# Altium footprint library SparkFun-Retired.PCBLIB: 303 footprints (part 14 of 19)
Each footprint in its own frame and in the unit in brackets; x right, y up, seen from the top. Pads: shape width x height; smd on the part's side, far side on the other; paste and mask are expansions set on the pad; w line width, h text height; cw(c..) or ccw(c..) is an arc to the next point about the centre after c.
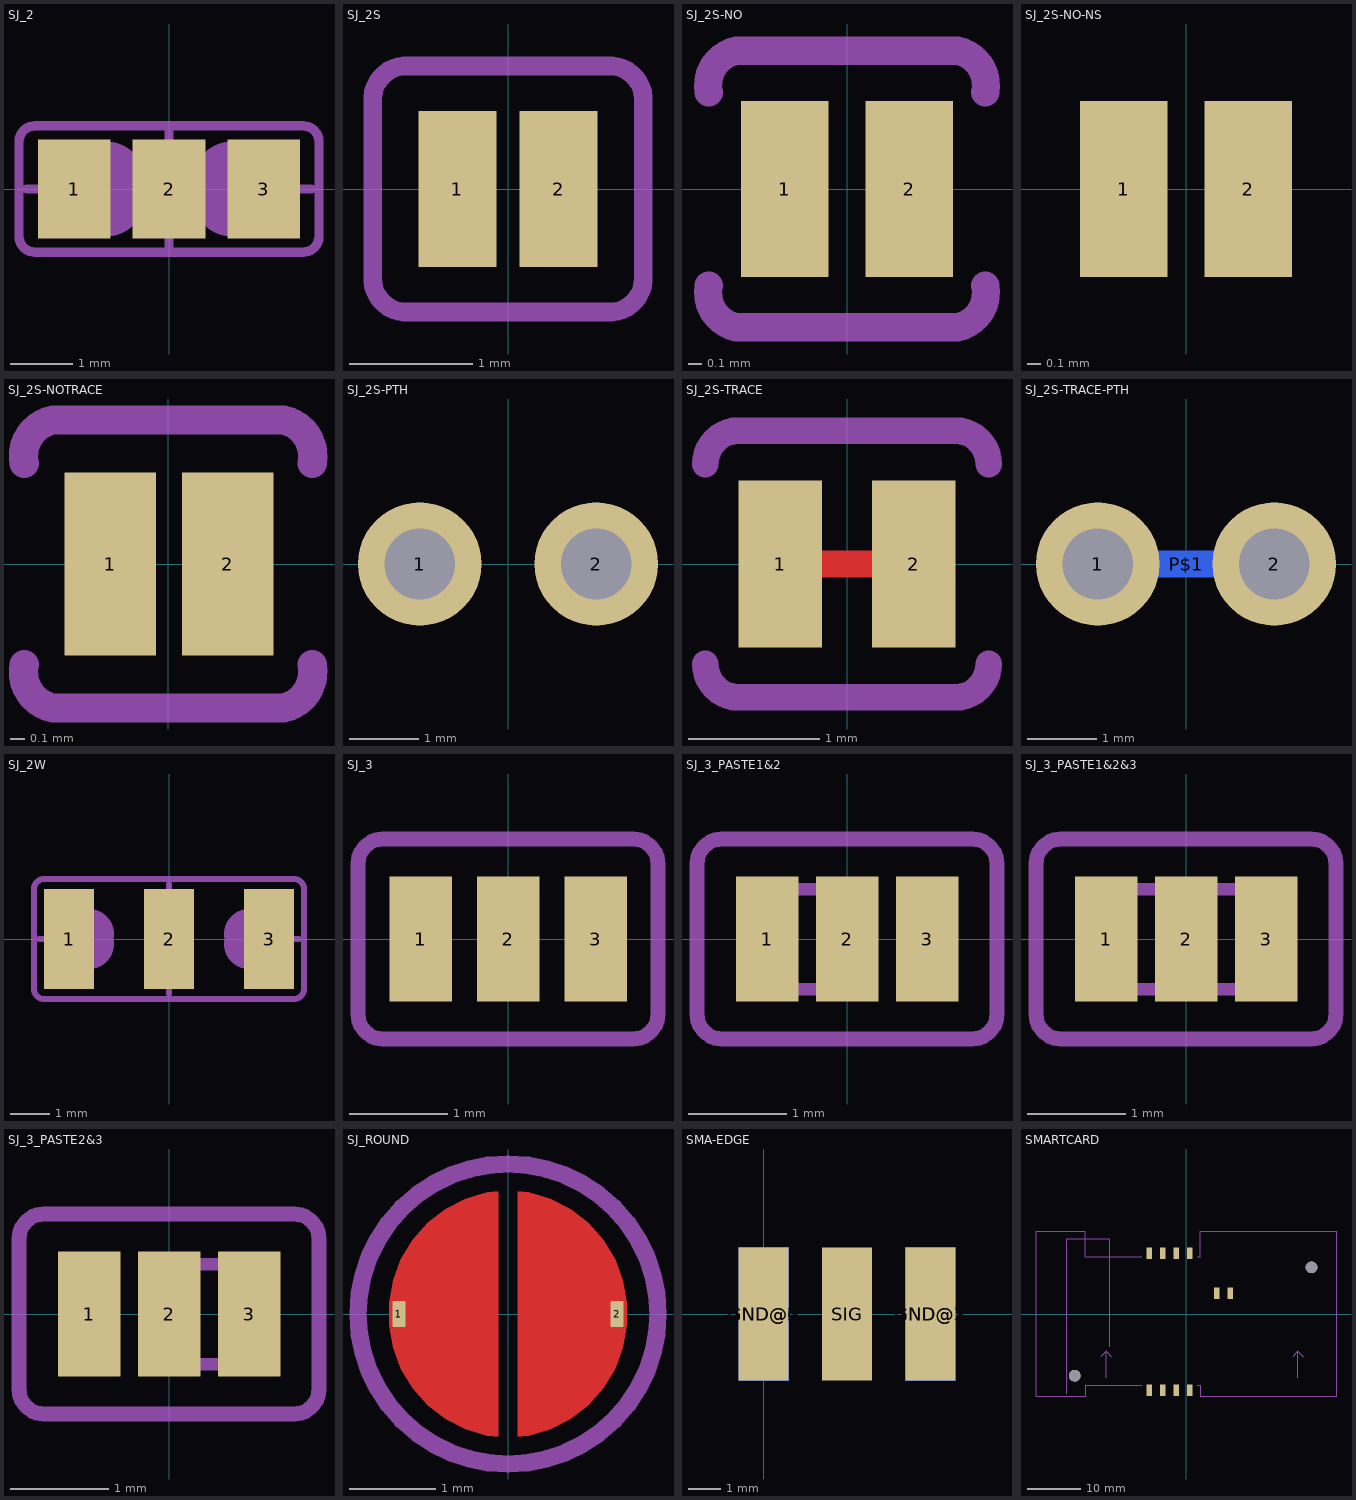
[diagram p13: the footprints below, top view; thin cyan lines are the x and y axes]

## SJ_2 [mil]
pads (3):
  rect 46x63 smd: 1(-60,0) 2(0,0) 3(60,0)
tDocu:
  region: -20,-30 -20,30 20,30 20,-30
  lines w6: -90,0 -70,0 ; 0,-40 0,-30 ; 0,30 0,40 ; 70,0 90,0
  lines w50: -40,-5 cw(c-40,0) -40,5 ; 40,-5 ccw(c40,0) 40,5
tPlace:
  lines w6: -95,-30 ccw(c-85,-30) -85,-40 85,-40 ccw(c85,-30) 95,-30 95,30 ccw(c85,30) 85,40 -85,40 ccw(c-85,30) -95,30 -95,-30

## SJ_2S [mil]
pads (2):
  rect 25x50 smd: 1(-16.22,0) 2(16.22,0)
Top Paste:
  region: -48,-45 -48,45 48,45 48,-45
tPlace:
  lines w6: -43.31,-29.53 ccw(c-32.49,-28.56) -31.5,-39.37 31.5,-39.37 ccw(c32.48,-28.55) 43.31,-29.53 43.31,29.53 ccw(c32.48,28.55) 31.5,39.37 -31.5,39.37 ccw(c-32.48,28.55) -43.31,29.53 -43.31,-29.53

## SJ_2S-NO [mil]
pads (2):
  rect 25x50 smd paste+0: 1(-17.72,0) 2(17.72,0)
tPlace:
  lines w8: -39.37,-27.56 ccw(c-29.53,-29.53) -31.5,-39.37 31.5,-39.37 ccw(c29.53,-29.53) 39.37,-27.56 ; -39.37,27.56 cw(c-29.53,29.53) -31.5,39.37 31.5,39.37 cw(c29.53,29.53) 39.37,27.56

## SJ_2S-NO-NS [mil]
pads (2):
  rect 25x50 smd paste+0: 1(-17.72,0) 2(17.72,0)

## SJ_2S-NOTRACE [mil]
pads (2):
  rect 25x50 smd paste+0: 1(-15.78,0) 2(16.25,0)
Top Paste:
  region: -40,-40 -40,40 40,40 40,-40
tPlace:
  lines w8: -39.37,-27.56 ccw(c-29.53,-29.53) -31.5,-39.37 31.5,-39.37 ccw(c29.53,-29.53) 39.37,-27.56 ; -39.37,27.56 cw(c-29.53,29.53) -31.5,39.37 31.5,39.37 cw(c29.54,29.54) 39.37,27.56

## SJ_2S-PTH [mil]
pads (2):
  round 70 hole 40: 1(-50,0) 2(50,0)

## SJ_2S-TRACE [mil]
pads (2):
  rect 25x50 smd paste+0: 1(-20,0) 2(20,0)
Top:
  lines w8: -15,0 15,0
tPlace:
  lines w8: -42.5,-30 ccw(c-32.5,-30) -32.5,-40 32.5,-40 ccw(c32.5,-30) 42.5,-30 ; -42.5,30 cw(c-32.5,30) -32.5,40 32.5,40 cw(c32.5,30) 42.5,30

## SJ_2S-TRACE-PTH [mil]
pads (3):
  round 70 hole 40: 1(-50,0) 2(50,0)
  rect 50x15 smd far side: P$1(0,0)
Bottom Solder:
  region: -12,-50 -12,50 12,50 12,-50

## SJ_2W [mil]
pads (3):
  rect 50x100 smd: 1(-100,0) 2(0,0) 3(100,0)
tDocu:
  region: -20,-30 -20,30 20,30 20,-30
  lines w6: -130,0 -110,0 ; 0,-55 0,-30 ; 0,30 0,55 ; 110,0 130,0
  lines w50: -80,-5 cw(c-80,0) -80,5 ; 80,-5 ccw(c80,0) 80,5
tPlace:
  lines w6: -135,-50 ccw(c-125,-50) -125,-60 125,-60 ccw(c125,-50) 135,-50 135,50 ccw(c125,50) 125,60 -125,60 ccw(c-125,50) -135,50 -135,-50

## SJ_3 [mil]
pads (3):
  rect 25x50 smd paste+0: 1(-35,0) 2(0,0) 3(35,0)
tPlace:
  lines w6: -60,-30 ccw(c-50,-30) -50,-40 50,-40 ccw(c50,-30) 60,-30 60,30 ccw(c50,30) 50,40 -50,40 ccw(c-50,30) -60,30 -60,-30

## SJ_3_PASTE1&2 [mil]
pads (3):
  rect 25x50 smd paste+0: 1(-32,0) 2(0,0) 3(32,0)
Top Paste:
  region: -57,-40 -57,37 11,37 11,-40
tDocu:
  lines w5: -40,-20 -40,20 7.5,20 7.5,-20 -40,-20
  text "PASTE" at -30,-17.5 h15.5
tPlace:
  lines w6: -60,-30 ccw(c-50,-30) -50,-40 50,-40 ccw(c50,-30) 60,-30 60,30 ccw(c50,30) 50,40 -50,40 ccw(c-50,30) -60,30 -60,-30

## SJ_3_PASTE1&2&3 [mil]
pads (3):
  rect 25x50 smd paste+0: 1(-32,0) 2(0,0) 3(32,0)
Top Paste:
  region: -56,-39 -56,39 56,39 56,-39
tDocu:
  lines w5: -40,-20 -40,20 40,20 40,-20 -40,-20
  text "PASTE" at -13.05,-17.5 h15.5
tPlace:
  lines w6: -60,-30 ccw(c-50,-30) -50,-40 50,-40 ccw(c50,-30) 60,-30 60,30 ccw(c50,30) 50,40 -50,40 ccw(c-50,30) -60,30 -60,-30

## SJ_3_PASTE2&3 [mil]
pads (3):
  rect 25x50 smd paste+0: 1(-32,0) 2(0,0) 3(32,0)
Top Paste:
  region: -11,-40 -11,39 56,39 56,-40
tDocu:
  lines w5: -7.5,-20 -7.5,20 40,20 40,-20 -7.5,-20
  text "PASTE" at 2.5,-17.5 h15.5
tPlace:
  lines w6: -60,-30 ccw(c-50,-30) -50,-40 50,-40 ccw(c50,-30) 60,-30 60,30 ccw(c50,30) 50,40 -50,40 ccw(c-50,30) -60,30 -60,-30

## SJ_ROUND [mil]
pads (2):
  rrect20% 6x12 smd paste+0 mask+0: 1(-50,0) 2(50,0)
Top:
  region: 4.38,-56.25 9.53,-55.72 19.46,-52.78 28.68,-48.06 36.88,-41.72 43.76,-33.98 49.09,-25.1 52.7,-15.39 54.46,-5.18 54.38,0 54.46,5.18 52.7,15.39 49.09,25.1 43.76,33.98 36.88,41.72 28.68,48.06 19.46,52.78 9.53,55.72 4.38,56.25
  region: -4.38,56.25 -4.38,-56.25 -9.53,-55.72 -19.46,-52.78 -28.68,-48.06 -36.88,-41.72 -43.76,-33.98 -49.09,-25.1 -52.7,-15.39 -54.46,-5.18 -54.38,0 -54.46,5.18 -52.7,15.39 -49.09,25.1 -43.76,33.98 -36.88,41.72 -28.68,48.06 -19.46,52.78 -9.53,55.72 -4.38,56.25
Top Solder:
  region: 0,56.25 5.54,56.25 16.41,54.09 26.64,49.85 35.86,43.69 43.69,35.86 49.85,26.64 54.09,16.41 56.25,5.54 56.25,0 56.25,-5.54 54.09,-16.41 49.85,-26.64 43.69,-35.86 35.86,-43.69 26.64,-49.85 16.41,-54.09 5.54,-56.25 0,-56.25 -5.54,-56.25 -16.41,-54.09 -26.64,-49.85 -35.86,-43.69 -43.69,-35.86 -49.85,-26.64 -54.09,-16.41 -56.25,-5.54 -56.25,0 -56.25,5.54 -54.09,16.41 -49.85,26.64 -43.69,35.86 -35.86,43.69 -26.64,49.85 -16.41,54.09 -5.54,56.25 0,56.25
tPlace:
  circle w8: c0,0 r68.75

## SMA-EDGE [mil]
pads (5):
  rect 60x160 smd paste+0: GND@0(0,0) GND@1(200,0) SIG(100,0)
  rect 60x160 smd far side: GND@2(0,0) GND@3(200,0)

## SMARTCARD [mm]
pads (12):
  rect 1x2.1 smd: C1(-6.92,11.4) C2(-4.38,11.4) C3(-1.84,11.4) C4(0.7,11.4) C5(-6.92,-14.3) C6(-4.38,-14.3) C7(-1.84,-14.3) C8(0.7,-14.3) P1(5.78,3.91) P2(8.32,3.91)
  round 2.2 hole 2.2 unplated: MH1(23.56,8.75) MH2(-20.89,-11.57)
tDocu:
  lines w0.127: -22.5,-15 -22.5,14 -14.3,14 -14.3,-6.11
  lines w0.203: -16,-8 -15,-7 ; -15,-12 -15,-7 ; -14,-8 -15,-7 ; 20,-8 21,-7 ; 21,-12 21,-7 ; 22,-8 21,-7
  text "Card inserts this direction, up side down" at -14.478,-12.192 h1.57
  text "Card Mag Stripe" at -18.034,-6.604 h1.57
tPlace:
  lines w0.203: -8.29,-13.35 -18.89,-13.35 -18.89,-15.55 -28.15,-15.55 -28.15,15.55 -18.89,15.55 -18.89,10.7 -8.29,10.7 ; 2.11,-13.35 2.71,-13.35 2.71,-15.55 28.15,-15.55 28.15,15.55 2.71,15.55 2.71,10.7 2.11,10.7